# Altium footprint library Apalis Evaluation Board.PcbLib: 212 footprints (part 10 of 14)
Each footprint in its own frame and in the unit in brackets; x right, y up, seen from the top. Pads: shape width x height; smd on the part's side, far side on the other; paste and mask are expansions set on the pad; w line width, h text height; cw(c..) or ccw(c..) is an arc to the next point about the centre after c.
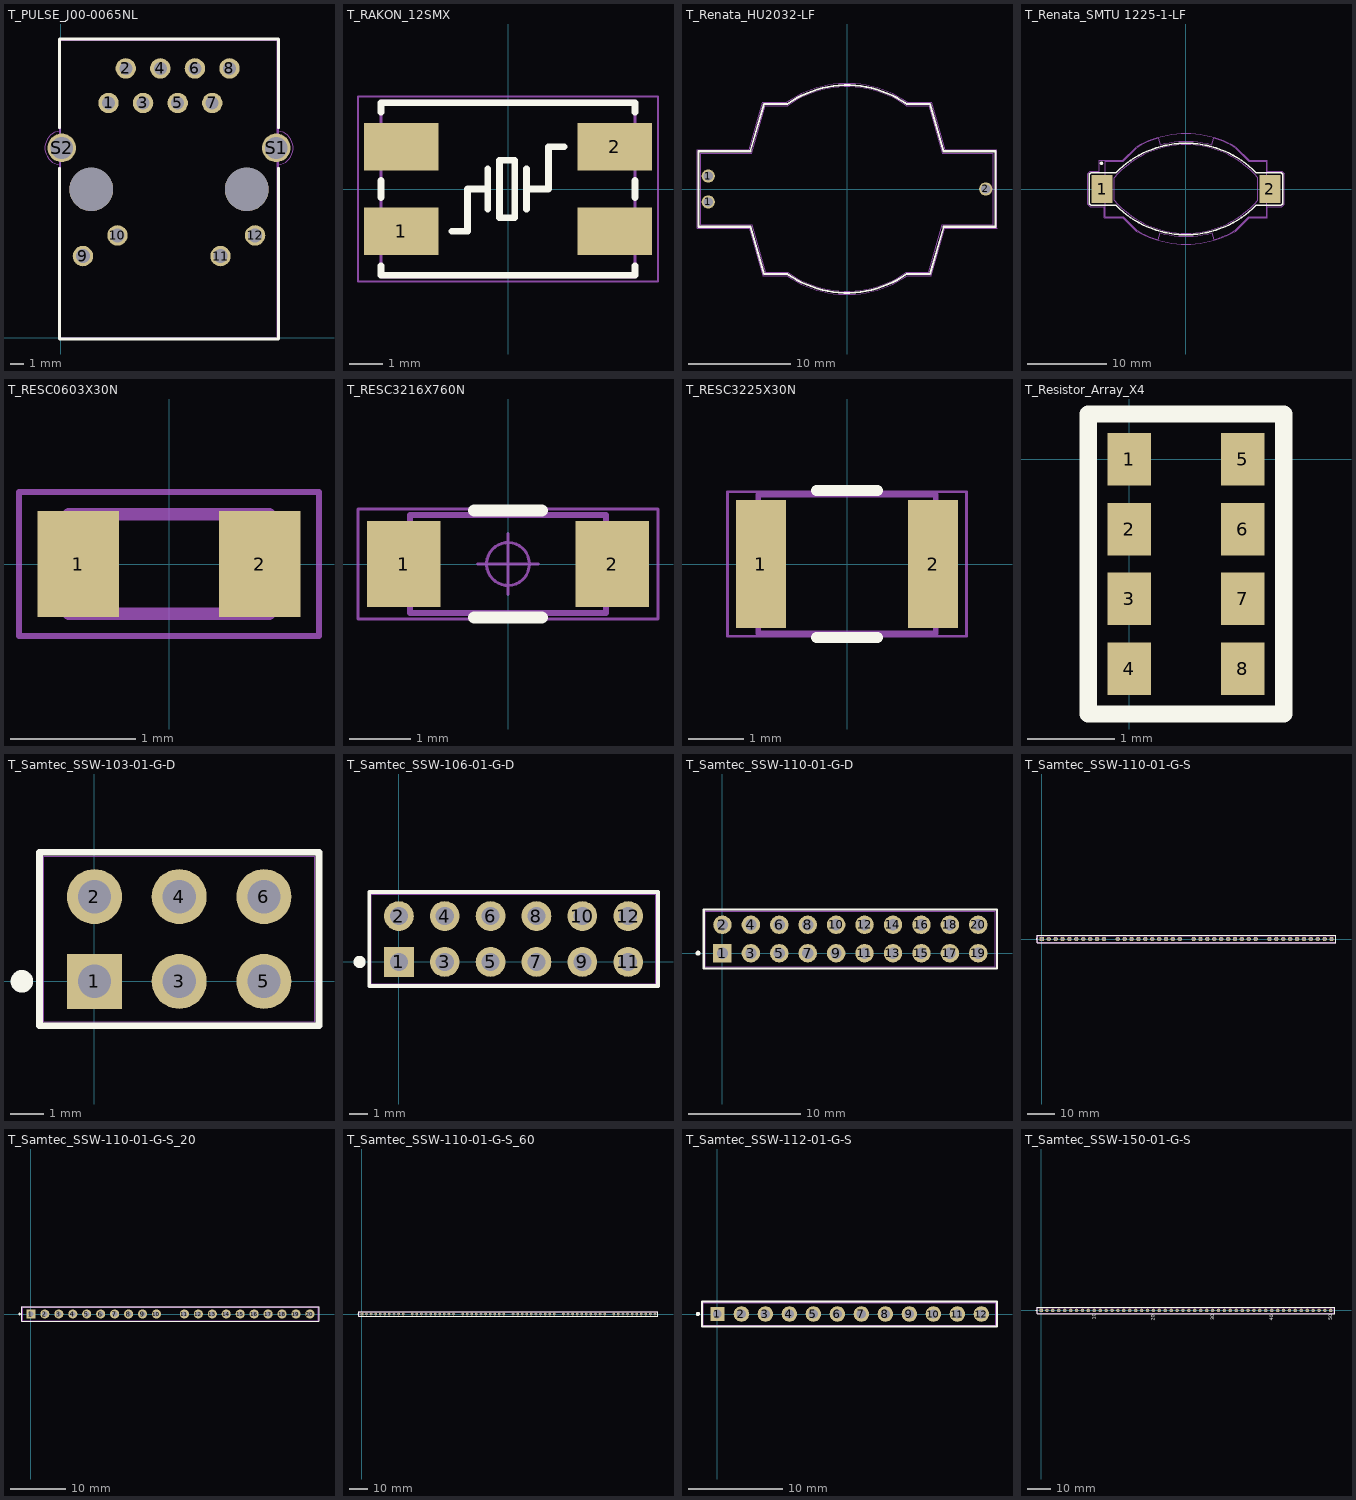
[diagram p9: the footprints below, top view; thin cyan lines are the x and y axes]

## T_PULSE_J00-0065NL [mm] "RJ45 Connector"
height 14.22
pads (16):
  round 1.5 hole 0.95: 1(3.495,17.24) 2(4.765,19.78) 3(6.035,17.24) 4(7.305,19.78) 5(8.575,17.24) 6(9.845,19.78) 7(11.115,17.24) 8(12.385,19.78)
  round 1.5 hole 1.02: 9(1.615,5.99) 10(4.155,7.51) 11(11.725,5.99) 12(14.265,7.51)
  round 2.1 hole 1.63: S1(15.815,13.94) S2(0.065,13.94)
  round 3.2 hole 3.2: ""(2.225,10.89) ""(13.655,10.89)
Top Overlay:
  lines w0.2: -0.102,12.446 -0.102,-0.102 15.983,-0.102 15.983,12.446 ; -0.102,15.418 -0.102,21.942 15.983,21.942 15.983,15.418
Mechanical 1:
  region: 5.81,17.065 5.81,17.415 6.26,17.415 6.26,17.065
  lines w0.05: -0.102,-0.102 -0.102,12.701 cw(c0.064,13.94) -0.101,15.179 -0.102,21.941 15.981,21.941 15.981,15.179 cw(c15.816,13.94) 15.981,12.701 15.981,-0.102 -0.102,-0.102
Mechanical 2:
  lines w0.001: 0,0 15.88,0 15.88,21.84 0,21.84 0,0
Mechanical 3:
  lines w0.1: -0.102,-0.102 15.983,-0.102 15.983,21.941 -0.102,21.941 -0.102,-0.102
3D body "7499010211A.stp": height 13.32, standoff -3.23, extent 0,0 15.88,21.84

## T_RAKON_12SMX [mm] "OSC"
height 1.4
pads (4):
  rect 2.2x1.4 smd: 1(-3.15,-1.25) 2(3.15,1.25) ""(-3.15,1.25) ""(3.15,-1.25)
Top Overlay:
  lines w0.2: -3.75,-2.55 3.75,-2.55 ; -3.75,-2.548 -3.75,-2.269 ; -3.75,-0.25 -3.75,0.25 ; -3.75,2.269 -3.75,2.548 ; -3.75,2.55 3.75,2.55 ; -1.65,-1.25 -1.2,-1.25 ; -0.6,-0.6 -0.6,0.6 ; -0.6,0 -1.2,0 -1.2,-1.25 ; 0.55,-0.6 0.55,0.6 ; 0.55,0 1.2,0 1.2,1.25 1.65,1.25 ; 3.75,-2.548 3.75,-2.269 ; 3.75,-0.25 3.75,0.25 ; 3.75,2.269 3.75,2.548 ; -1.2,-1.25 -1.2,-1.25 ; -0.25,-0.85 0.2,-0.85 0.2,0.85 -0.25,0.85 -0.25,-0.85
Mechanical 1:
  lines w0.05: -4.43,-2.73 -4.43,2.73 4.43,2.73 4.43,-2.73 -4.43,-2.73
Mechanical 2:
  lines w0.001: -3.75,-2.6 -3.75,2.6 3.75,2.6 3.75,-2.6 -3.75,-2.6
Mechanical 3:
  lines w0.1: -3.75,-2.6 -3.75,2.6 3.75,2.6 3.75,-2.6 -3.75,-2.6
3D body: height 1.4, standoff 0, extent -3.75,-2.6 3.75,2.6

## T_Renata_HU2032-LF [mm] "C2032 Battery Holder"
height 5.2
pads (3):
  round 1.3 hole 0.9: 1(-13.6,-1.27) 1(-13.6,1.27) 2(13.6,0)
Top Overlay:
  lines w0.2: -5.86,8.331 -8.133,8.331 -9.483,3.7 -14.55,3.7 -14.55,-3.7 ; -5.845,-8.331 -8.135,-8.331 -9.48,-3.7 -14.55,-3.7 ; -5.843,-8.33 ccw(c0,0) 5.839,-8.334 ; -5.839,8.334 cw(c0,0) 5.843,8.33 ; 5.845,8.331 8.135,8.331 9.48,3.7 14.55,3.7 ; 5.86,-8.331 8.133,-8.331 9.483,-3.7 14.55,-3.7 14.55,3.7 ; -14.55,-3.7 -14.55,-3.7 ; 14.55,3.7 14.55,3.7
Mechanical 1:
  lines w0.05: -14.702,-3.851 -14.702,3.849 -9.599,3.849 ; -14.7,-3.85 -9.599,-3.85 -8.252,-8.489 -5.895,-8.489 ccw(c0,0) 5.895,-8.489 8.252,-8.489 ; -9.599,3.849 -8.252,8.489 ; -8.252,8.489 -5.895,8.489 cw(c0,0) 5.895,8.489 8.252,8.489 9.599,3.85 14.7,3.85 14.7,-3.85 ; 8.252,-8.489 9.599,-3.849 ; 9.599,-3.849 14.702,-3.849
Mechanical 2:
  lines w0.01: -14.35,-3.5 -9.35,-3.5 -8,-8.15 -5.818,-8.15 ccw(c0,0) 5.818,-8.15 8,-8.15 9.35,-3.5 14.35,-3.5 14.35,3.5 9.35,3.5 8,8.15 5.818,8.15 ccw(c0,0) -5.818,8.15 -8,8.15 -9.35,3.5 -14.35,3.5 -14.35,-3.5
Mechanical 3:
  lines w0.1: -14.35,-3.5 -9.35,-3.5 -8,-8.15 -5.818,-8.15 ccw(c0,0) 5.818,-8.15 8,-8.15 9.35,-3.5 14.35,-3.5 14.35,3.5 9.35,3.5 8,8.15 5.818,8.15 ccw(c0,0) -5.818,8.15 -8,8.15 -9.35,3.5 -14.35,3.5 -14.35,-3.5
3D body: height 5.2, standoff 0, extent -14.35,-8.15 14.35,8.15
3D body: height 5.2, standoff 0, extent -10.417,-10.479 10.5,10.479

## T_Renata_SMTU 1225-1-LF [mm] "Battery Holder"
height 4.8
pads (2):
  rect 2.6x3.5 smd: 1(-10.55,0) 2(10.55,0)
Top Overlay:
  circle w0.2: c-10.625,3.25 r0.125
  lines w0.2: -8.8,2.05 -11.95,2.05 -12.15,1.85 -12.15,-1.85 -11.95,-2.05 -8.795,-2.05 ; -8.799,-2.05 ccw(c0,6.55) 8.794,-2.055 ; -8.794,2.055 cw(c0,-6.55) 8.799,2.05 ; 8.797,-2.05 11.95,-2.05 12.15,-1.85 12.15,1.86 11.96,2.05 8.797,2.05
Mechanical 1:
  lines w0.05: -7.924,-3.605 -10.247,-3.605 -10.247,-2.251 -12.024,-2.251 -12.357,-1.918 -12.357,1.926 -12.026,2.257 -10.918,2.257 -10.918,3.585 -7.95,3.585 -6.259,5.275 ; -7.92,-3.607 -6.244,-5.283 ; -6.262,5.274 cw(c0,-5.7) 6.276,5.266 ; -6.238,-5.288 ccw(c0,5.7) 6.239,-5.287 ; 6.244,-5.282 7.933,-3.593 10.237,-3.593 10.237,-2.245 12.04,-2.245 12.345,-1.94 12.345,1.939 12.037,2.247 10.242,2.247 10.242,3.589 7.956,3.589 6.281,5.265 6.281,5.266
Mechanical 2:
  lines w0.01: -6.194,5.206 -7.9,3.5 -10.15,3.5 -10.15,-3.5 -7.9,-3.5 -6.191,-5.209 ; -6.192,5.208 cw(c0.004,-5.568) -3.513,6.355 ; -6.189,-5.21 ccw(c0,5.57) -3.515,-6.353 ; -3.514,-6.353 -3.256,-5.514 ccw(c0.001,6.351) 3.246,-5.517 ; -3.513,6.354 -3.246,5.517 ; -3.245,5.516 cw(c0,-6.352) 3.246,5.516 3.505,6.356 cw(c0,-5.57) 6.189,5.21 ; 3.247,-5.517 3.517,-6.352 ccw(c0,5.57) 6.198,-5.205 7.903,-3.5 7.899,-3.5 10.15,-3.5 10.15,3.5 7.9,3.5 6.192,5.209
Mechanical 3:
  lines w0.1: -9.03,-1.42 -9.03,1.42 ; -9.028,-1.424 ccw(c0,6.357) 9.028,-1.424 ; -9.028,1.424 cw(c0,-6.357) 9.028,1.424 ; 9.026,-1.424 9.026,1.416

## T_RESC0603X30N [mm]
height 0.45
pads (2):
  rect 0.65x0.85 smd: 1(-0.725,0) 2(0.725,0)
Mechanical 1:
  lines w0.05: -1.2,-0.575 -1.2,0.575 1.2,0.575 1.2,-0.575 -1.2,-0.575
Mechanical 2:
  lines w0.001: -0.8,-0.4 -0.8,0.4 0.8,0.4 0.8,-0.4 -0.8,-0.4
Mechanical 3:
  lines w0.1: -0.8,-0.4 -0.8,0.4 0.8,0.4 0.8,-0.4 -0.8,-0.4
3D body: height 0.5, standoff 0, extent -0.8,-0.4 0.8,0.4

## T_RESC3216X760N [mm] "R1206"
height 0.6
pads (2):
  rect 1.2x1.4 smd: 1(-1.7,0) 2(1.7,0)
Top Overlay:
  lines w0.2: -0.55,-0.875 0.55,-0.875 ; -0.55,0.875 0.55,0.875
Mechanical 1:
  circle w0.05: c0,0 r0.35
  lines w0.05: -0.5,0 0.5,0 ; 0,-0.5 0,0.5 ; -2.45,-0.9 2.45,-0.9 2.45,0.9 -2.45,0.9 -2.45,-0.9
Mechanical 2:
  lines w0.001: -1.6,-0.8 -1.6,0.8 1.6,0.8 1.6,-0.8 -1.6,-0.8
Mechanical 3:
  lines w0.1: -1.6,-0.8 1.6,-0.8 1.6,0.8 -1.6,0.8 -1.6,-0.8
3D body: height 0.6, standoff 0, extent -1.6,-0.8 1.6,0.8

## T_RESC3225X30N [mm]
height 0.7
pads (2):
  rect 0.9x2.3 smd: 1(-1.55,0) 2(1.55,0)
Top Overlay:
  lines w0.2: -0.55,-1.325 0.55,-1.325 ; -0.55,1.325 0.55,1.325
Mechanical 1:
  lines w0.05: -2.15,-1.3 -2.15,1.3 2.15,1.3 2.15,-1.3 -2.15,-1.3
Mechanical 2:
  lines w0.001: -1.6,-1.25 1.6,-1.25 1.6,1.25 -1.6,1.25 -1.6,-1.25
Mechanical 3:
  lines w0.1: -1.6,-1.25 -1.6,1.25 1.6,1.25 1.6,-1.25 -1.6,-1.25
3D body: height 0.7, standoff 0, extent -1.6,-1.25 1.6,1.25

## T_Resistor_Array_X4 [mm] "Resistor Array 0.8mm,0603x4"
pads (8):
  rect 0.5x0.6 smd: 1(0,0) 2(0,-0.8) 3(0,-1.6) 4(0,-2.4) 5(1.3,0) 6(1.3,-0.8) 7(1.3,-1.6) 8(1.3,-2.4)
Top Overlay:
  lines w0.2: -0.47,-2.92 -0.47,0.52 1.77,0.52 1.77,-2.92 -0.47,-2.92
Mechanical 1:
  lines w0.05: -0.47,-2.92 -0.47,0.52 1.77,0.52 1.77,-2.92 -0.47,-2.92
Mechanical 2:
  lines w0.001: -0.47,-2.92 -0.47,0.52 1.77,0.52 1.77,-2.92 -0.47,-2.92
Mechanical 3:
  lines w0.1: -0.47,-2.92 -0.47,0.52 1.77,0.52 1.77,-2.92 -0.47,-2.92
3D body: height 0.55, standoff 0, extent -0.47,-2.92 1.77,0.52

## T_Samtec_SSW-103-01-G-D [mm] "Receptacle Female Socket  2x3 Pins, 2.54 mm pitch"
height 8.51
pads (6):
  rect 1.65x1.65 hole 1: 1(0,0)
  round 1.65 hole 1: 2(0,2.54) 3(2.54,0) 4(2.54,2.54) 5(5.08,0) 6(5.08,2.54)
Top Overlay:
  circle w0.5: c-2.175,0 r0.088
  lines w0.2: -1.65,-1.33 -1.65,3.87 6.73,3.87 6.73,-1.33 -1.65,-1.33
Mechanical 1:
  lines w0.05: -1.625,-1.305 6.705,-1.305 6.705,3.845 -1.625,3.845 -1.625,-1.305
Mechanical 2:
  lines w0.001: -1.525,-1.205 6.605,-1.205 6.605,3.745 -1.525,3.745 -1.525,-1.205
Mechanical 3:
  lines w0.1: -1.625,-1.305 -1.625,3.845 6.705,3.845 6.705,-1.305 -1.625,-1.305
3D body "Samtec-SSW-103-01-G-D.step": height 8.52, standoff -2.63, extent -1.524,-1.206 6.604,3.747

## T_Samtec_SSW-106-01-G-D [mm] "Receptacle Female Socket  2x6 Pins, 2.54 mm pitch"
height 8.51
pads (12):
  rect 1.65x1.65 hole 1: 1(0,0)
  round 1.65 hole 1: 2(0,2.54) 3(2.54,0) 4(2.54,2.54) 5(5.08,0) 6(5.08,2.54) 7(7.62,0) 8(7.62,2.54) 9(10.16,0) 10(10.16,2.54) 11(12.7,0) 12(12.7,2.54)
Top Overlay:
  circle w0.5: c-2.175,0 r0.088
  lines w0.2: -1.65,-1.33 14.35,-1.33 14.35,3.87 -1.65,3.87 -1.65,-1.33
Mechanical 1:
  lines w0.05: -1.625,-1.305 -1.625,3.845 14.325,3.845 14.325,-1.305 -1.625,-1.305
Mechanical 2:
  lines w0.001: -1.525,-1.205 -1.525,3.745 14.225,3.745 14.225,-1.205 -1.525,-1.205
Mechanical 3:
  lines w0.1: -1.625,-1.305 -1.625,3.845 14.325,3.845 14.325,-1.305 -1.625,-1.305
3D body "Samtec-SSW-106-01-G-D.step": height 8.52, standoff -2.63, extent -1.524,-1.206 14.224,3.747

## T_Samtec_SSW-110-01-G-D [mm] "Receptacle Female Socket  2x10 Pins, 2.54 mm pitch"
height 8.51
pads (20):
  rect 1.65x1.65 hole 1: 1(0,0)
  round 1.65 hole 1: 2(0,2.54) 3(2.54,0) 4(2.54,2.54) 5(5.08,0) 6(5.08,2.54) 7(7.62,0) 8(7.62,2.54) 9(10.16,0) 10(10.16,2.54) 11(12.7,0) 12(12.7,2.54) 13(15.24,0) 14(15.24,2.54) 15(17.78,0) 16(17.78,2.54) 17(20.32,0) 18(20.32,2.54) 19(22.86,0) 20(22.86,2.54)
Top Overlay:
  circle w0.25: c-2.173,0.002 r0.1
  lines w0.2: -1.675,-1.358 24.535,-1.358 24.535,3.897 -1.675,3.897 -1.675,-1.358
Mechanical 1:
  lines w0.05: -1.675,-1.358 -1.675,3.897 24.535,3.897 24.535,-1.358 -1.675,-1.358
Mechanical 2:
  lines w0.001: -1.524,-1.206 -1.524,3.747 24.384,3.747 24.384,-1.206 -1.524,-1.206
Mechanical 3:
  lines w0.1: -1.524,-1.206 -1.524,3.747 24.384,3.747 24.384,-1.206 -1.524,-1.206
3D body "Samtec-SSW-110-01-G-D.step": height 8.52, standoff -2.63, extent -1.524,-1.206 24.384,3.747

## T_Samtec_SSW-110-01-G-S [mm] "Receptacle Female Socket,  1x40 Pins, 2.54 mm pitch"
height 8.51
pads (40):
  rect 1.65x1.65 hole 1: 1(0,0)
  round 1.65 hole 1: 2(2.54,0) 3(5.08,0) 4(7.62,0) 5(10.16,0) 6(12.7,0) 7(15.24,0) 8(17.78,0) 9(20.32,0) 10(22.86,0) 11(27.94,0) 12(30.48,0) 13(33.02,0) 14(35.56,0) 15(38.1,0) 16(40.64,0) 17(43.18,0) 18(45.72,0) 19(48.26,0) 20(50.8,0) 21(55.88,0) 22(58.42,0) 23(60.96,0) 24(63.5,0) 25(66.04,0) 26(68.58,0) 27(71.12,0) 28(73.66,0) 29(76.2,0) 30(78.74,0) 31(83.82,0) 32(86.36,0) 33(88.9,0) 34(91.44,0) 35(93.98,0) 36(96.52,0) 37(99.06,0) 38(101.6,0) 39(104.14,0) 40(106.68,0)
Top Overlay:
  circle w0.25: c-2.067,0.006 r0.1
  lines w0.2: -1.65,-1.33 -1.65,1.33 108.33,1.33 108.33,-1.33 -1.65,-1.33
Mechanical 1:
  lines w0.05: -1.625,-1.305 108.305,-1.305 108.305,1.305 -1.625,1.305 -1.625,-1.305
Mechanical 2:
  lines w0.001: -1.525,-1.205 108.205,-1.205 108.205,1.205 -1.525,1.205 -1.525,-1.205
Mechanical 3:
  lines w0.1: -1.625,-1.305 -1.625,1.305 108.305,1.305 108.305,-1.305 -1.625,-1.305
3D body "Samtec-SSW-110-01-G-P.step": height 8.52, standoff -2.63, extent 82.296,-1.206 108.204,1.207
3D body "Samtec-SSW-110-01-G-P.step": height 8.52, standoff -2.63, extent 54.356,-1.206 80.264,1.207
3D body "Samtec-SSW-110-01-G-P.step": height 8.52, standoff -2.63, extent 26.416,-1.206 52.324,1.207
3D body "Samtec-SSW-110-01-G-P.step": height 8.52, standoff -2.63, extent -1.524,-1.206 24.384,1.207

## T_Samtec_SSW-110-01-G-S_20 [mm] "Receptacle Female Socket 1x20 Pins, 2.54 mm pitch"
height 8.51
pads (20):
  rect 1.65x1.65 hole 1: 1(0,0)
  round 1.65 hole 1: 2(2.54,0) 3(5.08,0) 4(7.62,0) 5(10.16,0) 6(12.7,0) 7(15.24,0) 8(17.78,0) 9(20.32,0) 10(22.86,0) 11(27.94,0) 12(30.48,0) 13(33.02,0) 14(35.56,0) 15(38.1,0) 16(40.64,0) 17(43.18,0) 18(45.72,0) 19(48.26,0) 20(50.8,0)
Top Overlay:
  circle w0.25: c-2.067,0.006 r0.1
  lines w0.2: -1.65,-1.33 -1.65,1.33 52.45,1.33 52.45,-1.33 -1.65,-1.33
Mechanical 1:
  lines w0.05: -1.625,-1.305 52.425,-1.305 52.425,1.305 -1.625,1.305 -1.625,-1.305
Mechanical 2:
  lines w0.001: -1.525,-1.205 52.325,-1.205 52.325,1.205 -1.525,1.205 -1.525,-1.205
Mechanical 3:
  lines w0.1: -1.625,-1.305 -1.625,1.305 52.425,1.305 52.425,-1.305 -1.625,-1.305
3D body "Samtec-SSW-110-01-G-P.step": height 8.52, standoff -2.63, extent 26.416,-1.206 52.324,1.207
3D body "Samtec-SSW-110-01-G-P.step": height 8.52, standoff -2.63, extent -1.524,-1.206 24.384,1.207

## T_Samtec_SSW-110-01-G-S_60 [mm] "Receptacle Female Socket , 1x60 Pins, 2.54 mm pitch"
height 8.51
pads (60):
  rect 1.5x1.5 hole 0.9: 1(0,0)
  round 1.5 hole 0.9: 2(2.54,0) 3(5.08,0) 4(7.62,0) 5(10.16,0) 6(12.7,0) 7(15.24,0) 8(17.78,0) 9(20.32,0) 10(22.86,0) 11(27.94,0) 12(30.48,0) 13(33.02,0) 14(35.56,0) 15(38.1,0) 16(40.64,0) 17(43.18,0) 18(45.72,0) 19(48.26,0) 20(50.8,0) 21(55.88,0) 22(58.42,0) 23(60.96,0) 24(63.5,0) 25(66.04,0) 26(68.58,0) 27(71.12,0) 28(73.66,0) 29(76.2,0) 30(78.74,0) 31(83.82,0) 32(86.36,0) 33(88.9,0) 34(91.44,0) 35(93.98,0) 36(96.52,0) 37(99.06,0) 38(101.6,0) 39(104.14,0) 40(106.68,0) 41(111.76,0) 42(114.3,0) 43(116.84,0) 44(119.38,0) 45(121.92,0) 46(124.46,0) 47(127,0) 48(129.54,0) 49(132.08,0) 50(134.62,0) 51(139.7,0) 52(142.24,0) 53(144.78,0) 54(147.32,0) 55(149.86,0) 56(152.4,0) 57(154.94,0) 58(157.48,0) 59(160.02,0) 60(162.56,0)
Top Overlay:
  circle w0.25: c-2.067,0.006 r0.1
  lines w0.2: -1.65,-1.33 164.21,-1.33 164.21,1.33 -1.65,1.33 -1.65,-1.33
Mechanical 1:
  lines w0.05: -1.625,-1.305 -1.625,1.305 164.185,1.305 164.185,-1.305 -1.625,-1.305
Mechanical 2:
  lines w0.001: -1.525,-1.205 -1.525,1.205 164.085,1.205 164.085,-1.205 -1.525,-1.205
Mechanical 3:
  lines w0.1: -1.625,-1.305 164.185,-1.305 164.185,1.305 -1.625,1.305 -1.625,-1.305
3D body "Samtec-SSW-110-01-G-P.step": height 8.52, standoff -2.63, extent 138.176,-1.206 164.084,1.207
3D body "Samtec-SSW-110-01-G-P.step": height 8.52, standoff -2.63, extent -1.524,-1.206 24.384,1.207
3D body "Samtec-SSW-110-01-G-P.step": height 8.52, standoff -2.63, extent 26.416,-1.206 52.324,1.207
3D body "Samtec-SSW-110-01-G-P.step": height 8.52, standoff -2.63, extent 54.356,-1.206 80.264,1.207
3D body "Samtec-SSW-110-01-G-P.step": height 8.52, standoff -2.63, extent 82.296,-1.206 108.204,1.207
3D body "Samtec-SSW-110-01-G-P.step": height 8.52, standoff -2.63, extent 110.236,-1.206 136.144,1.207

## T_Samtec_SSW-112-01-G-S [mm] "Receptacle Female Socket 1x12 Pins, 2.54 mm pitch"
height 8.51
pads (12):
  rect 1.5x1.5 hole 0.9: 1(0,0)
  round 1.65 hole 1: 2(2.54,0) 3(5.08,0) 4(7.62,0) 5(10.16,0) 6(12.7,0) 7(15.24,0) 8(17.78,0) 9(20.32,0) 10(22.86,0) 11(25.4,0) 12(27.94,0)
Top Overlay:
  circle w0.25: c-2.067,0.006 r0.1
  lines w0.2: -1.65,-1.33 -1.65,1.33 29.59,1.33 29.59,-1.33 -1.65,-1.33
Mechanical 1:
  lines w0.05: -1.625,-1.305 29.565,-1.305 29.565,1.305 -1.625,1.305 -1.625,-1.305
Mechanical 2:
  lines w0.01: -1.525,-1.205 29.465,-1.205 29.465,1.205 -1.525,1.205 -1.525,-1.205
Mechanical 3:
  lines w0.1: -1.625,-1.305 -1.625,1.305 29.565,1.305 29.565,-1.305 -1.625,-1.305
3D body "Samtec-SSW-112-01-G-S.step": height 8.52, standoff -2.63, extent -1.524,-1.206 29.464,1.207

## T_Samtec_SSW-150-01-G-S [mm] "Receptacle Female Socket , 1x50 Pins, 2.54 mm pitch"
height 8.51
pads (50):
  rect 1.5x1.5 hole 0.9: 1(0,0)
  round 1.5 hole 0.9: 2(2.54,0) 3(5.08,0) 4(7.62,0) 5(10.16,0) 6(12.7,0) 7(15.24,0) 8(17.78,0) 9(20.32,0) 10(22.86,0) 11(25.4,0) 12(27.94,0) 13(30.48,0) 14(33.02,0) 15(35.56,0) 16(38.1,0) 17(40.64,0) 18(43.18,0) 19(45.72,0) 20(48.26,0) 21(50.8,0) 22(53.34,0) 23(55.88,0) 24(58.42,0) 25(60.96,0) 26(63.5,0) 27(66.04,0) 28(68.58,0) 29(71.12,0) 30(73.66,0) 31(76.2,0) 32(78.74,0) 33(81.28,0) 34(83.82,0) 35(86.36,0) 36(88.9,0) 37(91.44,0) 38(93.98,0) 39(96.52,0) 40(99.06,0) 41(101.6,0) 42(104.14,0) 43(106.68,0) 44(109.22,0) 45(111.76,0) 46(114.3,0) 47(116.84,0) 48(119.38,0) 49(121.92,0) 50(124.46,0)
Top Overlay:
  circle w0.25: c-2.067,0.006 r0.1
  lines w0.2: -1.65,-1.33 126.11,-1.33 126.11,1.33 -1.65,1.33 -1.65,-1.33
  text "50" at 125.146,-4.216 h1.52
  text "40" at 99.771,-4.394 h1.52
  text "30" at 74.333,-4.242 h1.52
  text "20" at 48.933,-4.369 h1.52
  text "10" at 23.495,-4.051 h1.52
Mechanical 1:
  lines w0.05: -1.625,-1.305 -1.625,1.305 126.085,1.305 126.085,-1.305 -1.625,-1.305
Mechanical 2:
  lines w0.001: -1.525,-1.205 -1.525,1.205 125.985,1.205 125.985,-1.205 -1.525,-1.205
Mechanical 3:
  lines w0.1: -1.625,-1.305 126.085,-1.305 126.085,1.305 -1.625,1.305 -1.625,-1.305
3D body "Samtec-SSW-150-01-G-S.step": height 8.52, standoff -2.63, extent -1.524,-1.206 125.984,1.207